# Altium footprint library Standard2.PcbLib: 423 footprints (part 6 of 27)
Each footprint in its own frame and in the unit in brackets; x right, y up, seen from the top. Pads: shape width x height; smd on the part's side, far side on the other; paste and mask are expansions set on the pad; w line width, h text height; cw(c..) or ccw(c..) is an arc to the next point about the centre after c.
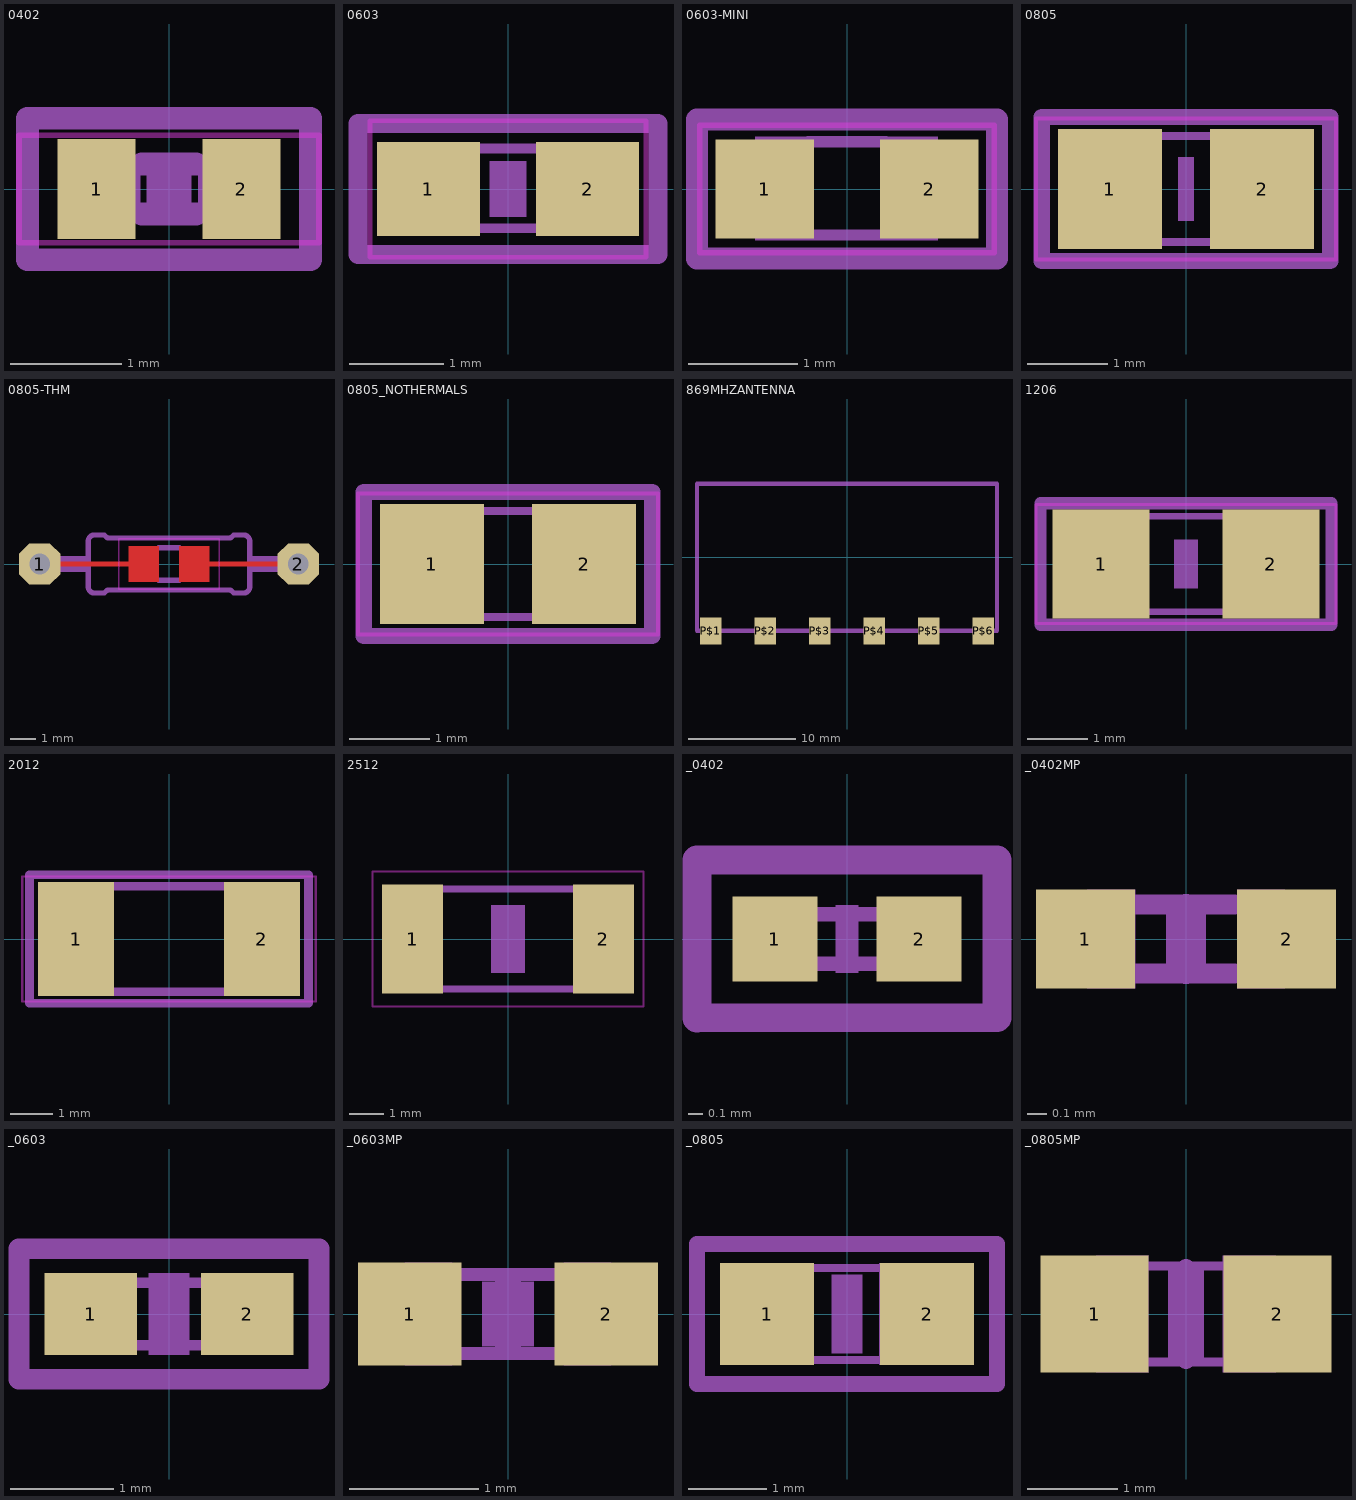
[diagram p5: the footprints below, top view; thin cyan lines are the x and y axes]

## 0402 [mm]
pads (2):
  rect 0.7x0.9 smd: 1(-0.65,0) 2(0.65,0)
Keep-Out Layer:
  lines w0.051: -1.346,-0.483 1.346,-0.483 1.346,0.483 -1.346,0.483 -1.346,-0.483
Mechanical 2:
  lines w0.203: -1.27,-0.635 -1.27,0.635 1.27,0.635 1.27,-0.635 -1.27,-0.635
Mechanical 8:
  rectangle: -0.2,-0.3 0.2,0.3
Mechanical 18:
  rectangle: -0.554,-0.305 -0.254,0.295
  rectangle: 0.259,-0.305 0.559,0.295
  lines w0.203: -0.245,-0.224 0.245,-0.224 ; -0.245,0.224 0.245,0.224

## 0603 [mm]
pads (2):
  rect 1.1x1 smd: 1(-0.85,0) 2(0.85,0)
Keep-Out Layer:
  lines w0.051: -1.473,-0.729 1.473,-0.729 1.473,0.729 -1.473,0.729 -1.473,-0.729
Mechanical 2:
  lines w0.203: -1.6,-0.7 1.6,-0.7 1.6,0.7 -1.6,0.7 -1.6,-0.7
Mechanical 8:
  rectangle: -0.2,-0.3 0.2,0.3
Mechanical 18:
  rectangle: -0.838,-0.47 -0.338,0.48
  rectangle: 0.33,-0.47 0.83,0.48
  lines w0.102: -0.356,-0.419 0.356,-0.419 ; -0.356,0.432 0.356,0.432

## 0603-MINI [mm]
pads (2):
  rect 0.9x0.9 smd: 1(-0.75,0) 2(0.75,0)
Keep-Out Layer:
  lines w0.051: -1.346,-0.583 -1.346,0.583 1.346,0.583 1.346,-0.583 -1.346,-0.583
Mechanical 2:
  lines w0.203: -1.37,-0.635 1.37,-0.635 1.37,0.635 -1.37,0.635 -1.37,-0.635
Mechanical 18:
  rectangle: 0.33,-0.47 0.83,0.48
  rectangle: -0.838,-0.47 -0.338,0.48
  lines w0.102: -0.356,-0.419 0.356,-0.419 ; -0.356,0.432 0.356,0.432

## 0805 [mm]
pads (2):
  rect 1.3x1.5 smd: 1(-0.95,0) 2(0.95,0)
Keep-Out Layer:
  lines w0.051: -1.873,-0.883 -1.873,0.883 1.873,0.883 1.873,-0.883 -1.873,-0.883
Mechanical 2:
  lines w0.203: -1.8,-0.9 -1.8,0.9 1.8,0.9 1.8,-0.9 -1.8,-0.9
Mechanical 8:
  rectangle: -0.1,-0.4 0.1,0.4
Mechanical 18:
  rectangle: 0.356,-0.724 1.106,0.726
  rectangle: -1.092,-0.724 -0.342,0.726
  lines w0.102: -0.381,0.66 0.381,0.66 ; -0.356,-0.66 0.381,-0.66

## 0805-THM [mil]
pads (2):
  oct 63.9x63.9 hole 32: 1(-200,0) 2(200,0)
Top Layer:
  rectangle: -62.99,-27.56 -15.75,27.56
  rectangle: 15.75,-27.56 62.99,27.56
  lines w8: -177.17,0 -43.31,0 ; 39.37,0 200.79,0
Top Paste:
  rectangle: -62.99,-27.56 -15.75,27.56
  rectangle: 15.75,-27.56 62.99,27.56
Top Solder:
  rectangle: -66.93,-31.5 -11.81,31.5
  rectangle: 11.81,-31.5 66.93,31.5
Keep-Out Layer:
  lines w2: -77.68,-38.7 77.68,-38.7 77.68,38.7 -77.68,38.7 -77.68,-38.7
Mechanical 2:
  rectangle: 125,-12 159,12
  rectangle: -159,-12 -125,12
  lines w8: -125,-35 ccw(c-115,-35) -115,-45 -100,-45 -95,-40 95,-40 100,-45 115,-45 ccw(c115,-35) 125,-35 125,35 ccw(c115,35) 115,45 100,45 95,40 -95,40 -100,45 -115,45 ccw(c-115,35) -125,35 -125,-35
Mechanical 18:
  rectangle: 16,-27.5 41.59,27.62
  rectangle: -42,-27.5 -16.41,27.62
  lines w8: -16.14,-25 16.14,-25 ; -16.14,25 16.14,25
  lines w24: -200,0 -160,0 ; 160,0 200,0

## 0805_NOTHERMALS [mm]
pads (2):
  rect 1.3x1.5 smd: 1(-0.95,0) 2(0.95,0)
Keep-Out Layer:
  lines w0.051: -1.873,-0.883 -1.873,0.883 1.873,0.883 1.873,-0.883 -1.873,-0.883
Mechanical 2:
  lines w0.203: -1.8,-0.9 -1.8,0.9 1.8,0.9 1.8,-0.9 -1.8,-0.9
Mechanical 18:
  rectangle: 0.356,-0.724 1.106,0.726
  rectangle: -1.092,-0.724 -0.342,0.726
  lines w0.102: -0.381,0.66 0.381,0.66 ; -0.356,-0.66 0.381,-0.66

## 869MHZANTENNA [mm]
pads (6):
  rect 2x2.5 smd: P$1(-12.7,-6.858) P$2(-7.62,-6.858) P$3(-2.54,-6.858) P$4(2.54,-6.858) P$5(7.62,-6.858) P$6(12.7,-6.858)
Mechanical 18:
  lines w0.406: -13.97,-6.858 13.97,-6.858 13.97,6.858 -13.97,6.858 -13.97,-6.858

## 1206 [mm]
pads (2):
  rect 1.6x1.8 smd: 1(-1.4,0) 2(1.4,0)
Keep-Out Layer:
  lines w0.051: -2.473,-0.983 -2.473,0.983 2.473,0.983 2.473,-0.983 -2.473,-0.983
Mechanical 2:
  lines w0.203: -2.4,-1 -2.4,1 2.4,1 2.4,-1 -2.4,-1
Mechanical 8:
  rectangle: -0.2,-0.4 0.2,0.4
Mechanical 18:
  rectangle: 0.952,-0.849 1.702,0.851
  rectangle: -1.702,-0.851 -0.952,0.849
  lines w0.102: -0.965,-0.787 0.965,-0.787 ; -0.965,0.787 0.965,0.787

## 2012 [mm]
pads (2):
  rect 1.8x2.7 smd: 1(-2.2,0) 2(2.2,0)
Keep-Out Layer:
  lines w0.051: -3.473,-1.483 -3.473,1.483 3.473,1.483 3.473,-1.483 -3.473,-1.483
Mechanical 2:
  lines w0.203: -3.302,-1.524 -3.302,1.524 3.302,1.524 3.302,-1.524 -3.302,-1.524
Mechanical 18:
  rectangle: 1.651,-1.321 2.501,1.329
  rectangle: -2.489,-1.321 -1.639,1.329
  lines w0.203: -1.662,1.245 1.662,1.245 ; -1.637,-1.245 1.687,-1.245

## 2512 [mm]
pads (2):
  rect 1.8x3.2 smd: 1(-2.8,0) 2(2.8,0)
Keep-Out Layer:
  lines w0.051: -3.973,-1.983 -3.973,1.983 3.973,1.983 3.973,-1.983 -3.973,-1.983
Mechanical 8:
  rectangle: -0.5,-1 0.5,1
Mechanical 18:
  rectangle: 2.362,-1.549 3.212,1.551
  rectangle: -3.2,-1.549 -2.351,1.551
  lines w0.203: -2.362,-1.473 2.387,-1.473 ; -2.362,1.473 2.387,1.473

## _0402 [mil]
pads (2):
  rect 23.62x23.62 smd: 1(-20,0) 2(20,0)
Mechanical 2:
  lines w8: -41.63,-21.88 41.63,-21.87 41.63,21.88 -41.63,21.88 -41.63,-21.88
Mechanical 8:
  rectangle: -3.13,-9.37 3.13,9.37
Mechanical 18:
  rectangle: 9.84,-9.84 19.69,9.84
  rectangle: -19.69,-9.84 -9.84,9.84
  lines w4: -9.65,-6.85 9.65,-6.85 ; -9.65,6.85 9.65,6.85

## _0402MP [mil]
pads (2):
  rect 19.69x19.69 smd: 1(-20,0) 2(20,0)
Mechanical 2:
  lines w8: 0,-5 0,5
Mechanical 8:
  rectangle: -3.94,-7.87 3.94,7.87
Mechanical 18:
  rectangle: 10.19,-9.84 19.69,9.84
  rectangle: -19.69,-9.84 -10,9.84
  lines w4: -9.65,-6.85 9.65,-6.85 ; -9.65,6.85 9.65,6.85

## _0603 [mil]
pads (2):
  rect 35.43x31.5 smd: 1(-30,0) 2(30,0)
Mechanical 2:
  lines w8: -57.5,-25 -57.5,25 57.5,25 57.5,-25 -57.5,-25
Mechanical 8:
  rectangle: -7.87,-15.75 7.87,15.75
Mechanical 18:
  rectangle: -33,-15.75 -17,15.75
  rectangle: 17,-15.75 33,15.75
  lines w4: -17.01,-12.05 17.01,-12.05 ; -17.01,12.05 17.01,12.05

## _0603MP [mil]
pads (2):
  rect 31.5x31.5 smd: 1(-30,0) 2(30,0)
Mechanical 2:
  lines w8: 0,-10 0,10
Mechanical 8:
  rectangle: -7.87,-9.84 7.87,9.84
Mechanical 18:
  rectangle: -31.5,-15.75 -17,15.75
  rectangle: 17,-15.75 31.5,15.75
  lines w4: -17.01,-12.05 17.01,-12.05 ; -17.01,12.05 17.01,12.05

## _0805 [mil]
pads (2):
  rect 47.24x51.18 smd: 1(-40,0) 2(40,0)
Mechanical 2:
  lines w8: -75,-35 75,-35 75,35 -75,35 -75,-35
Mechanical 8:
  rectangle: -7.87,-19.69 7.87,19.69
Mechanical 18:
  rectangle: 16,-25.59 41.59,25.59
  rectangle: -42,-25.59 -16.41,25.59
  lines w4: -16.14,-23.03 16.14,-23.03 ; -16.14,23.03 16.14,23.03

## _0805MP [mil]
pads (2):
  rect 47.24x51.18 smd: 1(-40,0) 2(40,0)
Mechanical 2:
  lines w8: 0,-20 0,20
Mechanical 8:
  rectangle: -7.87,-19.69 7.87,19.69
Mechanical 18:
  rectangle: 16,-25.59 39.37,25.59
  rectangle: -39.37,-25.59 -16.41,25.59
  lines w4: -20.08,-21.06 20.08,-21.06 ; -20.08,21.06 20.08,21.06